# Altium footprint library biblioteka_pcb.PcbLib: 184 footprints (part 10 of 12)
Each footprint in its own frame and in the unit in brackets; x right, y up, seen from the top. Pads: shape width x height; smd on the part's side, far side on the other; paste and mask are expansions set on the pad; w line width, h text height; cw(c..) or ccw(c..) is an arc to the next point about the centre after c.
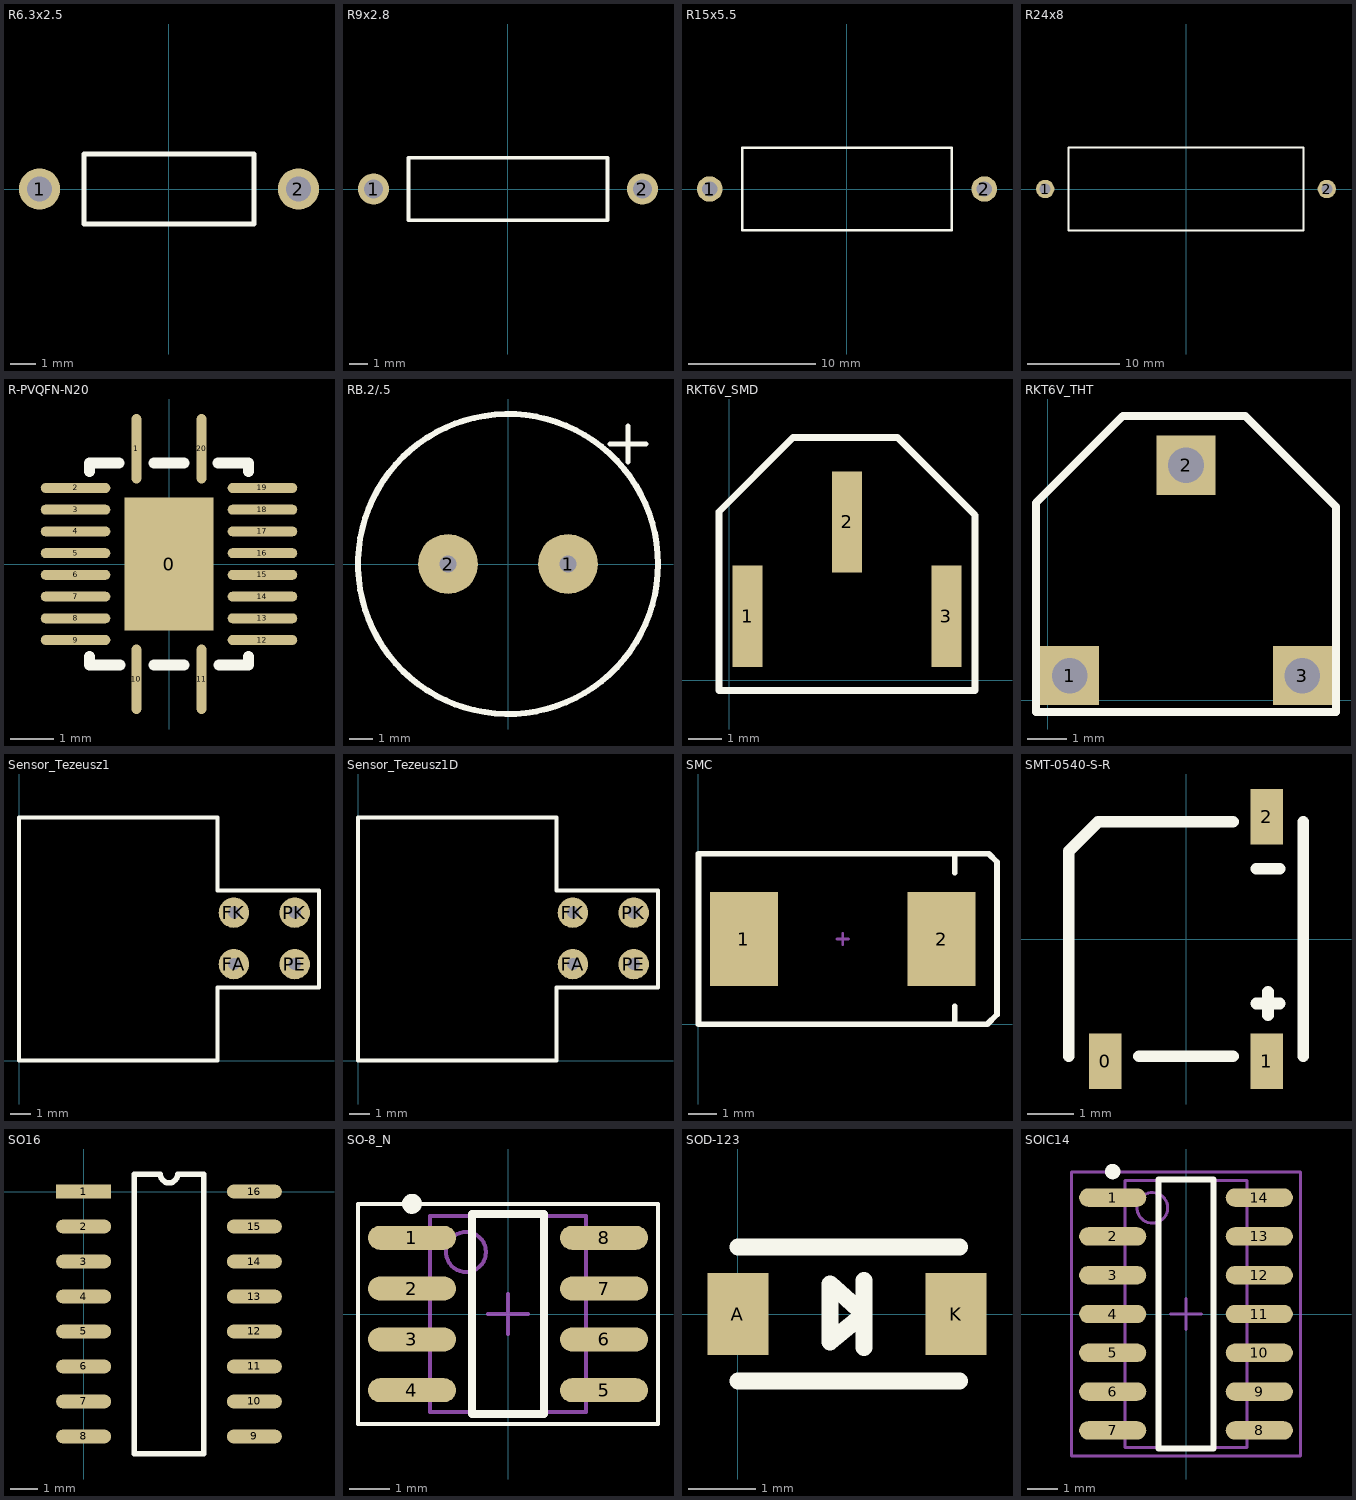
[diagram p9: the footprints below, top view; thin cyan lines are the x and y axes]

## R6.3x2.5 [mm] "Resistor, Axial; Body 6.8 x 2.7 mm (LxDia. max), Lead Dia. 0.65 mm (max)"
height 2.7
pads (2):
  round 1.65 hole 1: 1(-5.175,0) 2(5.175,0)
Top Overlay:
  lines w0.2: -3.4,-1.4 -3.4,1.4 3.4,1.4 3.4,-1.4 -3.4,-1.4

## R9x2.8 [mm] "Resistor, Axial; Body 10.5 x 3.3 mm (LxDia. max), Lead Dia. 0.7 mm (max)"
height 3.3
pads (2):
  round 1.65 hole 1: 1(-7.1,0) 2(7.1,0)
Top Overlay:
  lines w0.2: -5.25,-1.65 5.25,-1.65 5.25,1.65 -5.25,1.65 -5.25,-1.65

## R15x5.5 [mm] "Resistor, Axial; Body 16.5 x 6.5 mm (LxDia. max), Lead Dia. 0.85 mm (max)"
height 6.5
pads (2):
  round 2 hole 1.2: 1(-10.8,0) 2(10.8,0)
Top Overlay:
  lines w0.2: -8.25,-3.25 -8.25,3.25 8.25,3.25 8.25,-3.25 -8.25,-3.25

## R24x8 [mm] "Resistor, Axial; Body 25.5 x 9 mm (LxDia. max), Lead Dia. 0.85 mm (max)"
height 9
pads (2):
  round 2 hole 1.2: 1(-15.3,0) 2(15.3,0)
Top Overlay:
  lines w0.2: -12.75,-4.5 -12.75,4.5 12.75,4.5 12.75,-4.5 -12.75,-4.5

## R-PVQFN-N20 [mm]
pads (21):
  rect 2.05x3.05 smd: 0(0,0)
  oval 0.23x1.6 smd: 1(-0.75,2.65) 10(-0.75,-2.65) 11(0.75,-2.65) 20(0.75,2.65)
  oval 1.6x0.23 smd: 2(-2.15,1.75) 3(-2.15,1.25) 4(-2.15,0.75) 5(-2.15,0.25) 6(-2.15,-0.25) 7(-2.15,-0.75) 8(-2.15,-1.25) 9(-2.15,-1.75) 12(2.15,-1.75) 13(2.15,-1.25) 14(2.15,-0.75) 15(2.15,-0.25) 16(2.15,0.25) 17(2.15,0.75) 18(2.15,1.25) 19(2.15,1.75)
Top Overlay:
  lines w0.254: -1.825,-2.125 -1.825,-2.325 -1.125,-2.325 ; -1.825,2.125 -1.825,2.325 -1.15,2.325 ; -0.35,-2.325 0.35,-2.325 ; -0.35,2.325 0.35,2.325 ; 1.125,2.325 1.825,2.325 1.825,2.125 ; 1.15,-2.325 1.825,-2.325 1.825,-2.125

## RB.2/.5 [mil]
pads (2):
  round 100 hole 28: 1(100,0) 2(-100,0)
Top Overlay:
  circle w10: c0,0 r250
  lines w7.87: 170,200 230,200 ; 200,170 200,230
3D body: height 196.85, standoff 0, extent -114.17,-11.81 -90.64,11.76
3D body: height 196.85, standoff 0, extent 86.61,-7.87 110.14,15.7
3D body: height 1023.62, standoff 196.85, extent -244.09,-248.03 250.01,247.05

## RKT6V_SMD [mm] "SMD version of STK6V THT element"
pads (3):
  rect 0.9x3 smd: 1(0.55,1.9) 2(3.5,4.7) 3(6.45,1.9)
Top Overlay:
  lines w0.2: -0.3,-0.3 7.3,-0.3 7.3,4.9 5,7.2 1.9,7.2 -0.3,5 -0.3,4.7 -0.3,0 -0.3,-0.3
3D body "RTK6V-SMD.stp": height 7.5, standoff 0, extent 0,0 7,7

## RKT6V_THT [mm] "RTK6V THT version of THT element"
pads (3):
  rect 1.5x1.5 hole 0.9 square: 1(0.55,0.625) 2(3.5,5.95) 3(6.45,0.625)
Top Overlay:
  lines w0.2: -0.3,-0.3 7.3,-0.3 7.3,4.9 5,7.2 1.9,7.2 -0.3,5 -0.3,4.7 -0.3,0 -0.3,-0.3
3D body "RTK6V-THT.stp": height 7.5, standoff -2, extent 0,0 7,7

## Sensor_Tezeusz1 [mm] "Para fotodioda i fototranzystor dla Tezeusza1"
pads (4):
  round 1.5 hole 0.6: FA(10.6,4.76) FK(10.6,7.3) PE(13.6,4.76) PK(13.6,7.3)
Top Overlay:
  lines w0.2: 0,0 9.8,0 9.8,3.6 14.8,3.6 14.8,8.4 9.8,8.4 9.8,12 0,12 0,0
3D body "Sensor.stp": height 19, standoff -1.5, extent 0,0 13.848,12

## Sensor_Tezeusz1D [mm] "Para fotodioda i fototranzystor dla Tezeusza1"
pads (4):
  round 1.5 hole 0.6: FA(10.6,4.76) FK(10.6,7.3) PE(13.6,4.76) PK(13.6,7.3)
Top Overlay:
  lines w0.2: 0,0 0,12 9.8,12 9.8,8.4 14.8,8.4 14.8,3.6 9.8,3.6 9.8,0 0,0
3D body "Sensor.stp": height 19, standoff -1.5, extent 0,0 13.848,12

## SMC [mm] "DO-214-AB/SMC; 2 C-Bend Leads; Body 7.9 x 5.9 mm, inc. leads (LxW)"
height 2.57
pads (2):
  rect 2.4x3.3 smd: 1(1.6,3) 2(8.55,3)
Top Overlay:
  lines w0.1: -0.005,5.05 0,5.05
  lines w0.2: 0,0.95 0,5.05 ; 9.017,0 9.017,0.635 ; 9.017,5.334 9.017,6 ; 10.5,3.635 10.5,5.708 10.208,6 0,6 0,3 0,0 10.16,0 10.5,0.34 10.5,1.4 10.5,4.6
Mechanical 1:
  lines w0.1: 4.875,3 5.275,3 ; 5.075,2.8 5.075,3.2
3D body: height 2.21, standoff 1, extent 8.675,1 9.075,5
3D body: height 2.2, standoff 0, extent 0.075,0 10.075,6

## SMT-0540-S-R [mm]
pads (3):
  rect 0.7x1.2 smd: 0(-1.75,-2.65) 1(1.75,-2.65) 2(1.75,2.65)
Top Overlay:
  lines w0.254: -2.54,-2.54 -2.54,1.905 -1.905,2.54 1.016,2.54 ; -1.016,-2.54 1.016,-2.54 ; 1.524,-1.397 2.032,-1.397 ; 1.524,1.524 2.032,1.524 ; 1.778,-1.651 1.778,-1.143 ; 2.54,-2.54 2.54,2.54
3D body "SMT-0540-S-R SMD.stp": height 2.01, standoff 0, extent -2.5,-2.6 2.5,2.6

## SO16 [mm]
pads (16):
  rect 2x0.5 smd: 1(0,0)
  oval 2x0.5 smd: 2(0,-1.27) 3(0,-2.54) 4(0,-3.81) 5(0,-5.08) 6(0,-6.35) 7(0,-7.62) 8(0,-8.89) 9(6.2,-8.89) 10(6.2,-7.62) 11(6.2,-6.35) 12(6.2,-5.08) 13(6.2,-3.81) 14(6.2,-2.54) 15(6.2,-1.27) 16(6.2,0)
Top Overlay:
  lines w0.2: 1.835,-9.525 1.835,0.635 2.782,0.635 ccw(c3.1,0.635) 3.417,0.635 4.365,0.635 4.365,-9.525 1.835,-9.525
3D body "SO16.stp": height 1.45, standoff 0, extent 0,-9.365 6.2,0.635

## SO-8_N [mm]
pads (8):
  oval 2.2x0.6 smd: 1(-2.4,1.905) 2(-2.4,0.635) 3(-2.4,-0.635) 4(-2.4,-1.905) 5(2.4,-1.905) 6(2.4,-0.635) 7(2.4,0.635) 8(2.4,1.905)
Top Overlay:
  circle w0.25: c-2.4,2.755 r0.125
  lines w0.1: -3.75,-2.75 3.75,-2.75 3.75,2.75 -3.75,2.75 -3.75,-2.75
  lines w0.2: -0.9,-2.5 0.9,-2.5 0.9,2.5 -0.9,2.5 -0.9,-2.5
Mechanical 13:
  circle w0.1: c-1.05,1.55 r0.5
  lines w0.1: -1.95,-2.45 1.95,-2.45 1.95,2.45 -1.95,2.45 -1.95,-2.45
Mechanical 15:
  lines w0.1: -0.5,0 0.5,0 ; 0,-0.5 0,0.5
3D body "SOIC8.stp": height 1.75, standoff 0, extent -3.1,-2.511 3.1,2.489

## SOD-123 [mm]
pads (2):
  rect 0.91x1.22 smd: A(0,0) K(3.25,0)
Top Overlay:
  lines w0.254: 0,-1 3.3,-1 ; 0,1 3.3,1 ; 1.875,-0.5 1.875,0.5 1.875,0 ; 1.875,0 1.375,0.45 1.375,-0.414 1.875,0

## SOIC14 [mm] "SOIC, 14-Leads, Body 8.6x3.9mm, Pitch 1.27mm, IPC Medium Density"
height 1.75
pads (14):
  oval 2.2x0.6 smd: 1(-2.4,3.81) 2(-2.4,2.54) 3(-2.4,1.27) 4(-2.4,0) 5(-2.4,-1.27) 6(-2.4,-2.54) 7(-2.4,-3.81) 8(2.4,-3.81) 9(2.4,-2.54) 10(2.4,-1.27) 11(2.4,0) 12(2.4,1.27) 13(2.4,2.54) 14(2.4,3.81)
Top Overlay:
  circle w0.25: c-2.4,4.66 r0.125
  lines w0.2: -0.9,-4.4 0.9,-4.4 0.9,4.4 -0.9,4.4 -0.9,-4.4
Mechanical 13:
  circle w0.1: c-1.1,3.475 r0.5
  lines w0.1: -2,-4.375 2,-4.375 2,4.375 -2,4.375 -2,-4.375
Mechanical 15:
  lines w0.1: -0.5,0 0.5,0 ; 0,-0.5 0,0.5 ; -3.75,-4.65 3.75,-4.65 3.75,4.65 -3.75,4.65 -3.75,-4.65
3D body "SOP14.stp": height 1.8, standoff 0, extent -3,-4.4 3,4.3